# Altium footprint library EMDC_Packages.PcbLib: 274 footprints (part 8 of 18)
Each footprint in its own frame and in the unit in brackets; x right, y up, seen from the top. Pads: shape width x height; smd on the part's side, far side on the other; paste and mask are expansions set on the pad; w line width, h text height; cw(c..) or ccw(c..) is an arc to the next point about the centre after c.
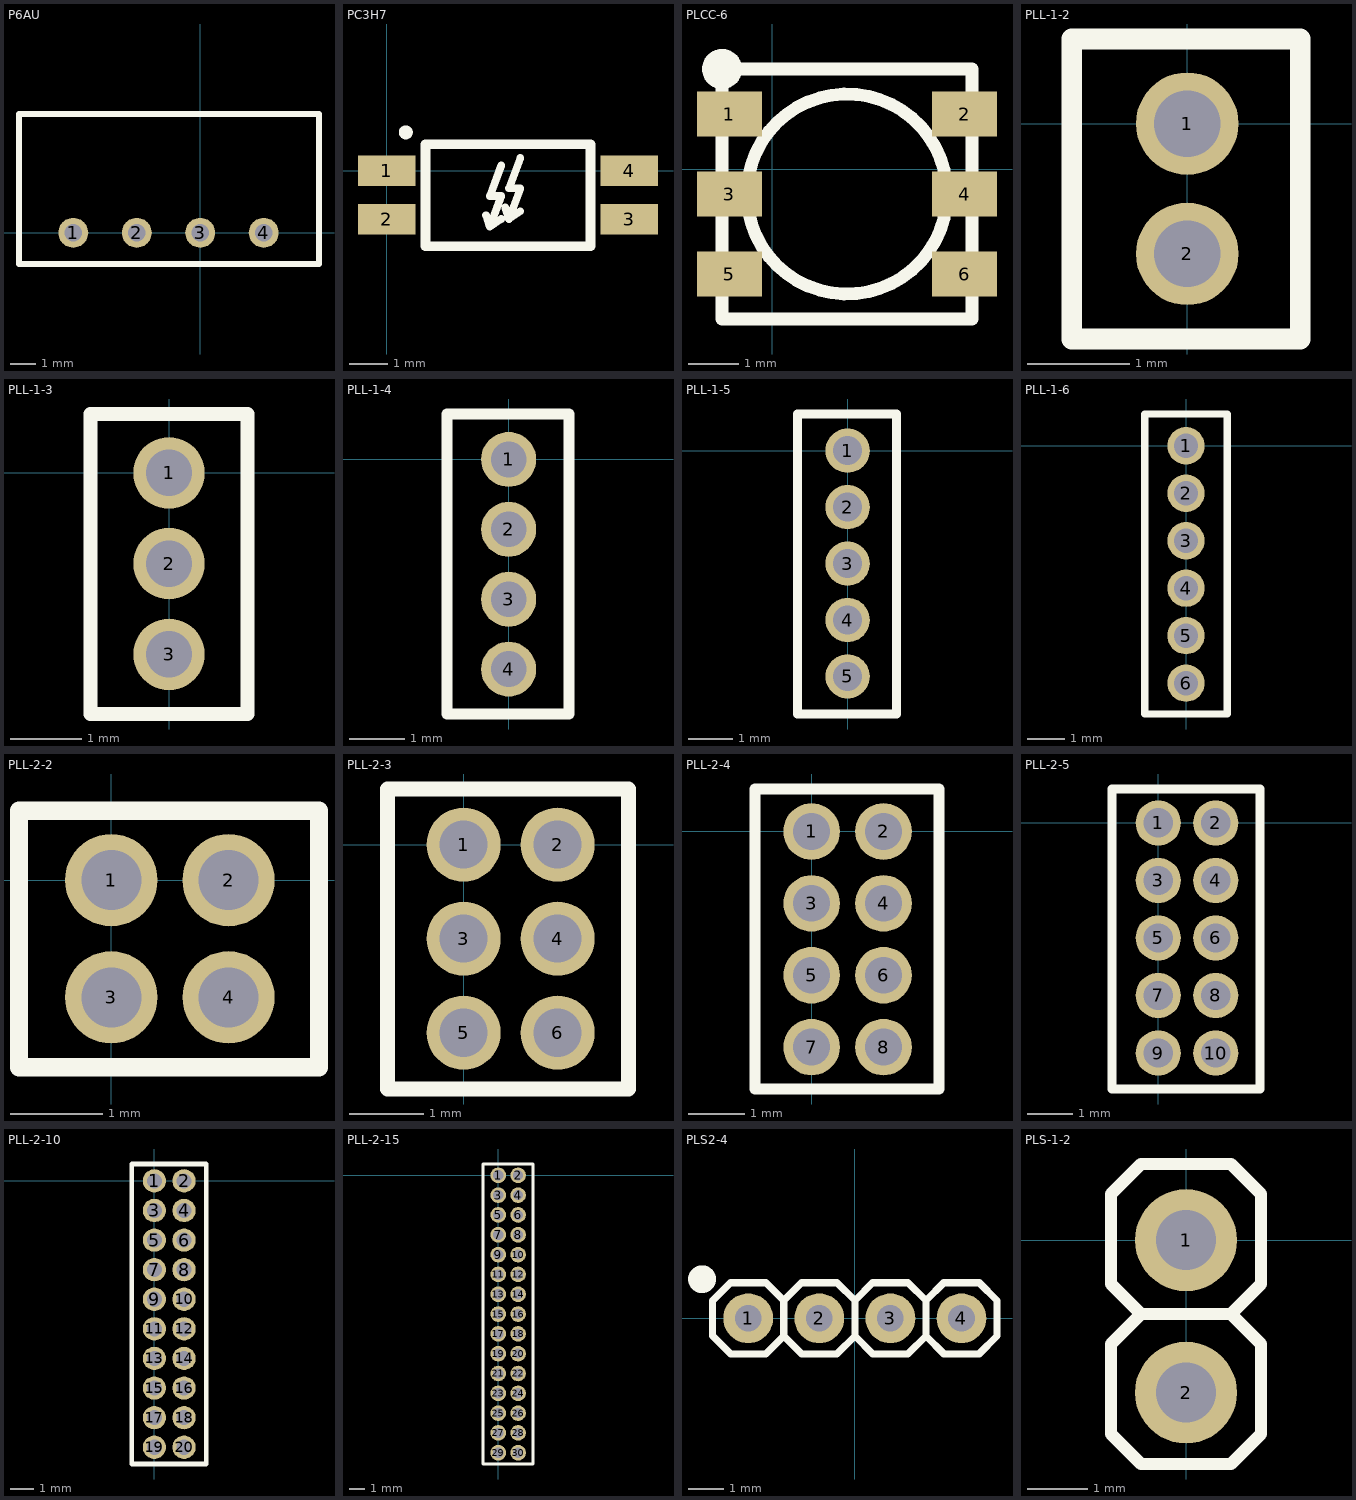
[diagram p7: the footprints below, top view; thin cyan lines are the x and y axes]

## P6AU [mm]
pads (4):
  round 1.2 hole 0.7: 1(-5.08,0) 2(-2.54,0) 3(0,0) 4(2.54,0)
Top Overlay:
  lines w0.254: -7.25,-1.25 4.75,-1.25 4.75,4.75 -7.25,4.75 -7.25,-1.25

## PC3H7 [mm]
pads (4):
  rect 1.5x0.8 smd: 1(0,0) 2(0,-1.27) 3(6.35,-1.27) 4(6.35,0)
Top Overlay:
  circle w0.254: c0.5,1 r0.056
  lines w0.2: 2.6,-1.167 2.7,-1.467 ; 3,-1.267 2.7,-1.467 ; 3,0.133 2.7,-0.667 3,-0.667 2.7,-1.467 ; 3.1,-0.967 3.2,-1.267 ; 3.5,-1.067 3.2,-1.267 ; 3.5,0.333 3.2,-0.467 3.5,-0.467 3.2,-1.267
  lines w0.254: 1.016,-1.981 5.334,-1.981 5.334,0.686 1.016,0.686 1.016,-1.981
3D body "User Library-PC3H7.step": height 2.1, standoff 0.05, extent -0.3,-1.9 6.7,0.7

## PLCC-6 [mm]
pads (6):
  rect 1.3x0.9 smd: 1(-0.85,1.1) 2(3.85,1.1) 3(-0.85,-0.5) 4(3.85,-0.5) 5(-0.85,-2.1) 6(3.85,-2.1)
Top Overlay:
  circle w0.4: c-1,2 r0.2
  circle w0.254: c1.5,-0.5 r2
  lines w0.254: -1,-3 4,-3 4,2 -1,2 -1,-3

## PLL-1-2 [mm]
pads (2):
  round 1 hole 0.65: 1(0,0) 2(0,-1.27)
Top Overlay:
  lines w0.2: -1.125,-2.1 -1.125,0.825 1.1,0.825 1.1,-2.1 -1.125,-2.1
3D body "PLL-2.stp": height 5.2, standoff -2.9, extent -1.1,-2.1 1.1,0.85

## PLL-1-3 [mm]
pads (3):
  round 1 hole 0.65: 1(0,0) 2(0,-1.27) 3(0,-2.54)
Top Overlay:
  lines w0.2: -1.1,-3.375 1.1,-3.375 1.1,0.825 -1.1,0.825 -1.1,-3.375
3D body "PLL-3.stp": height 5.2, standoff -2.9, extent -1.1,-3.38 1.1,0.84

## PLL-1-4 [mm]
pads (4):
  round 1 hole 0.65: 1(0,0) 2(0,-1.27) 3(0,-2.54) 4(0,-3.81)
Top Overlay:
  lines w0.2: -1.125,-4.625 -1.125,0.825 1.1,0.825 1.1,-4.625 -1.125,-4.625
3D body "PLL-2.stp": height 5.2, standoff -2.9, extent -1.1,-4.64 1.1,-1.69
3D body "PLL-2.stp": height 5.2, standoff -2.9, extent -1.1,-2.1 1.1,0.85

## PLL-1-5 [mm]
pads (5):
  round 1 hole 0.65: 1(0,0) 2(0,-1.27) 3(0,-2.54) 4(0,-3.81) 5(0,-5.08)
Top Overlay:
  lines w0.2: -1.125,-5.925 -1.125,0.825 1.1,0.825 1.1,-5.925 -1.125,-5.925
3D body "PLL-3.stp": height 5.2, standoff -2.9, extent -1.1,-5.92 1.1,-1.7
3D body "PLL-2.stp": height 5.2, standoff -2.9, extent -1.1,-2.1 1.1,0.85

## PLL-1-6 [mm]
pads (6):
  round 1 hole 0.65: 1(0,0) 2(0,-1.27) 3(0,-2.54) 4(0,-3.81) 5(0,-5.08) 6(0,-6.35)
Top Overlay:
  lines w0.2: -1.1,-7.175 1.1,-7.175 1.1,0.85 -1.1,0.85 -1.1,-7.175
3D body "PLL-3.stp": height 5.2, standoff -2.9, extent -1.1,-7.19 1.1,-2.97
3D body "PLL-3.stp": height 5.2, standoff -2.9, extent -1.1,-3.38 1.1,0.84

## PLL-2-2 [mm]
pads (4):
  round 1 hole 0.65: 1(0,0) 2(1.27,0) 3(0,-1.27) 4(1.27,-1.27)
Top Overlay:
  lines w0.2: -1,-2.025 2.25,-2.025 2.25,0.75 -1,0.75 -1,-2.025
3D body "User Library-PLLD1_27-xxPLLD1_27-4.STEP": height 4.7, standoff -2.6, extent -0.875,-1.905 2.125,0.635

## PLL-2-3 [mm]
pads (6):
  round 1 hole 0.65: 1(0,0) 2(1.27,0) 3(0,-1.27) 4(1.27,-1.27) 5(0,-2.54) 6(1.27,-2.54)
Top Overlay:
  lines w0.2: -1.025,-3.3 2.225,-3.3 2.225,0.75 -1.025,0.75 -1.025,-3.3
3D body "User Library-PLLD1_27-xxPLLD1_27-6.STEP": height 4.7, standoff -2.6, extent -0.9,-3.175 2.1,0.635

## PLL-2-4 [mm]
pads (8):
  round 1 hole 0.65: 1(0,0) 2(1.27,0) 3(0,-1.27) 4(1.27,-1.27) 5(0,-2.54) 6(1.27,-2.54) 7(0,-3.81) 8(1.27,-3.81)
Top Overlay:
  lines w0.2: -1,-4.55 2.25,-4.55 2.25,0.75 -1,0.75 -1,-4.55
3D body "User Library-PLLD1_27-xxPLLD1_27-8.STEP": height 4.7, standoff -2.6, extent -0.875,-4.445 2.125,0.635

## PLL-2-5 [mm]
pads (10):
  round 1 hole 0.65: 1(0,0) 2(1.27,0) 3(0,-1.27) 4(1.27,-1.27) 5(0,-2.54) 6(1.27,-2.54) 7(0,-3.81) 8(1.27,-3.81) 9(0,-5.08) 10(1.27,-5.08)
Top Overlay:
  lines w0.2: -1.025,-5.875 -1.025,0.75 2.25,0.75 2.25,-5.875 -1.025,-5.875
3D body "User Library-PLLD1_27-xxPLLD1_27-10.STEP": height 4.7, standoff -2.6, extent -0.875,-5.74 2.125,0.61

## PLL-2-10 [mm]
pads (20):
  round 1 hole 0.65: 1(0,0) 2(1.27,0) 3(0,-1.27) 4(1.27,-1.27) 5(0,-2.54) 6(1.27,-2.54) 7(0,-3.81) 8(1.27,-3.81) 9(0,-5.08) 10(1.27,-5.08) 11(0,-6.35) 12(1.27,-6.35) 13(0,-7.62) 14(1.27,-7.62) 15(0,-8.89) 16(1.27,-8.89) 17(0,-10.16) 18(1.27,-10.16) 19(0,-11.43) 20(1.27,-11.43)
Top Overlay:
  lines w0.2: -0.975,-12.15 -0.975,0.725 2.225,0.725 2.225,-12.15 -0.975,-12.15
3D body "User Library-PLLD1_27-xxPLLD1_27-20.STEP": height 4.7, standoff -2.6, extent -0.875,-12.065 2.125,0.635

## PLL-2-15 [mm]
pads (30):
  round 1 hole 0.65: 1(0,0) 2(1.27,0) 3(0,-1.27) 4(1.27,-1.27) 5(0,-2.54) 6(1.27,-2.54) 7(0,-3.81) 8(1.27,-3.81) 9(0,-5.08) 10(1.27,-5.08) 11(0,-6.35) 12(1.27,-6.35) 13(0,-7.62) 14(1.27,-7.62) 15(0,-8.89) 16(1.27,-8.89) 17(0,-10.16) 18(1.27,-10.16) 19(0,-11.43) 20(1.27,-11.43) 21(0,-12.7) 22(1.27,-12.7) 23(0,-13.97) 24(1.27,-13.97) 25(0,-15.24) 26(1.27,-15.24) 27(0,-16.51) 28(1.27,-16.51) 29(0,-17.78) 30(1.27,-17.78)
Top Overlay:
  lines w0.2: -0.975,-18.5 2.225,-18.5 2.225,-12.15 2.225,0.725 -0.975,0.725 -0.975,-12.15 -0.975,-18.5
3D body "User Library-PLLD1_27-xxPLLD1_27-30.STEP": height 4.7, standoff -2.6, extent -0.875,-18.415 2.125,0.635

## PLS2-4 [mm]
pads (4):
  round 1.4 hole 0.75: 1(-3,0) 2(-1,0) 3(1,0) 4(3,0)
Top Overlay:
  circle w0.5: c-4.3,1.1 r0.141
  lines w0.2: -2,-0.5 -2,0.5 ; -2,-0.5 -1.5,-1 -0.5,-1 0,-0.5 ; -2,-0.5 -2.5,-1 -3.5,-1 -4,-0.5 -4,0.5 -3.5,1 -2.5,1 -2,0.5 ; -2,0.5 -1.5,1 -0.5,1 0,0.5 ; 0,-0.5 0,0.5 ; 0,-0.5 0.5,-1 1.5,-1 2,-0.5 ; 0,0.5 0.5,1 1.5,1 2,0.5 ; 2,-0.5 2,0.5 ; 2,-0.5 2.5,-1 3.5,-1 4,-0.5 4,0.5 3.5,1 2.5,1 2,0.5

## PLS-1-2 [mm]
pads (2):
  round 1.7 hole 1 paste+0: 1(0,0) 2(0,-2.54)
Top Overlay:
  lines w0.2: -0.75,-1.23 -1.25,-0.73 -1.25,0.77 -0.75,1.27 0.75,1.27 1.25,0.77 1.25,-0.73 0.75,-1.23 ; -0.75,-1.23 -1.25,-1.73 -1.25,-3.23 -0.75,-3.73 0.75,-3.73 1.25,-3.23 1.25,-1.73 0.75,-1.23 ; -0.75,-1.23 0.75,-1.23
3D body "User Library-PLS-1.STEP": height 8.44, standoff -3, extent -1.27,-1.27 1.27,1.27
3D body "User Library-PLS-1.STEP": height 8.44, standoff -3, extent -1.27,-3.81 1.27,-1.27